# Altium footprint library Connectors.PcbLib: 60 footprints (part 2 of 4)
Each footprint in its own frame and in the unit in brackets; x right, y up, seen from the top. Pads: shape width x height; smd on the part's side, far side on the other; paste and mask are expansions set on the pad; w line width, h text height; cw(c..) or ccw(c..) is an arc to the next point about the centre after c.
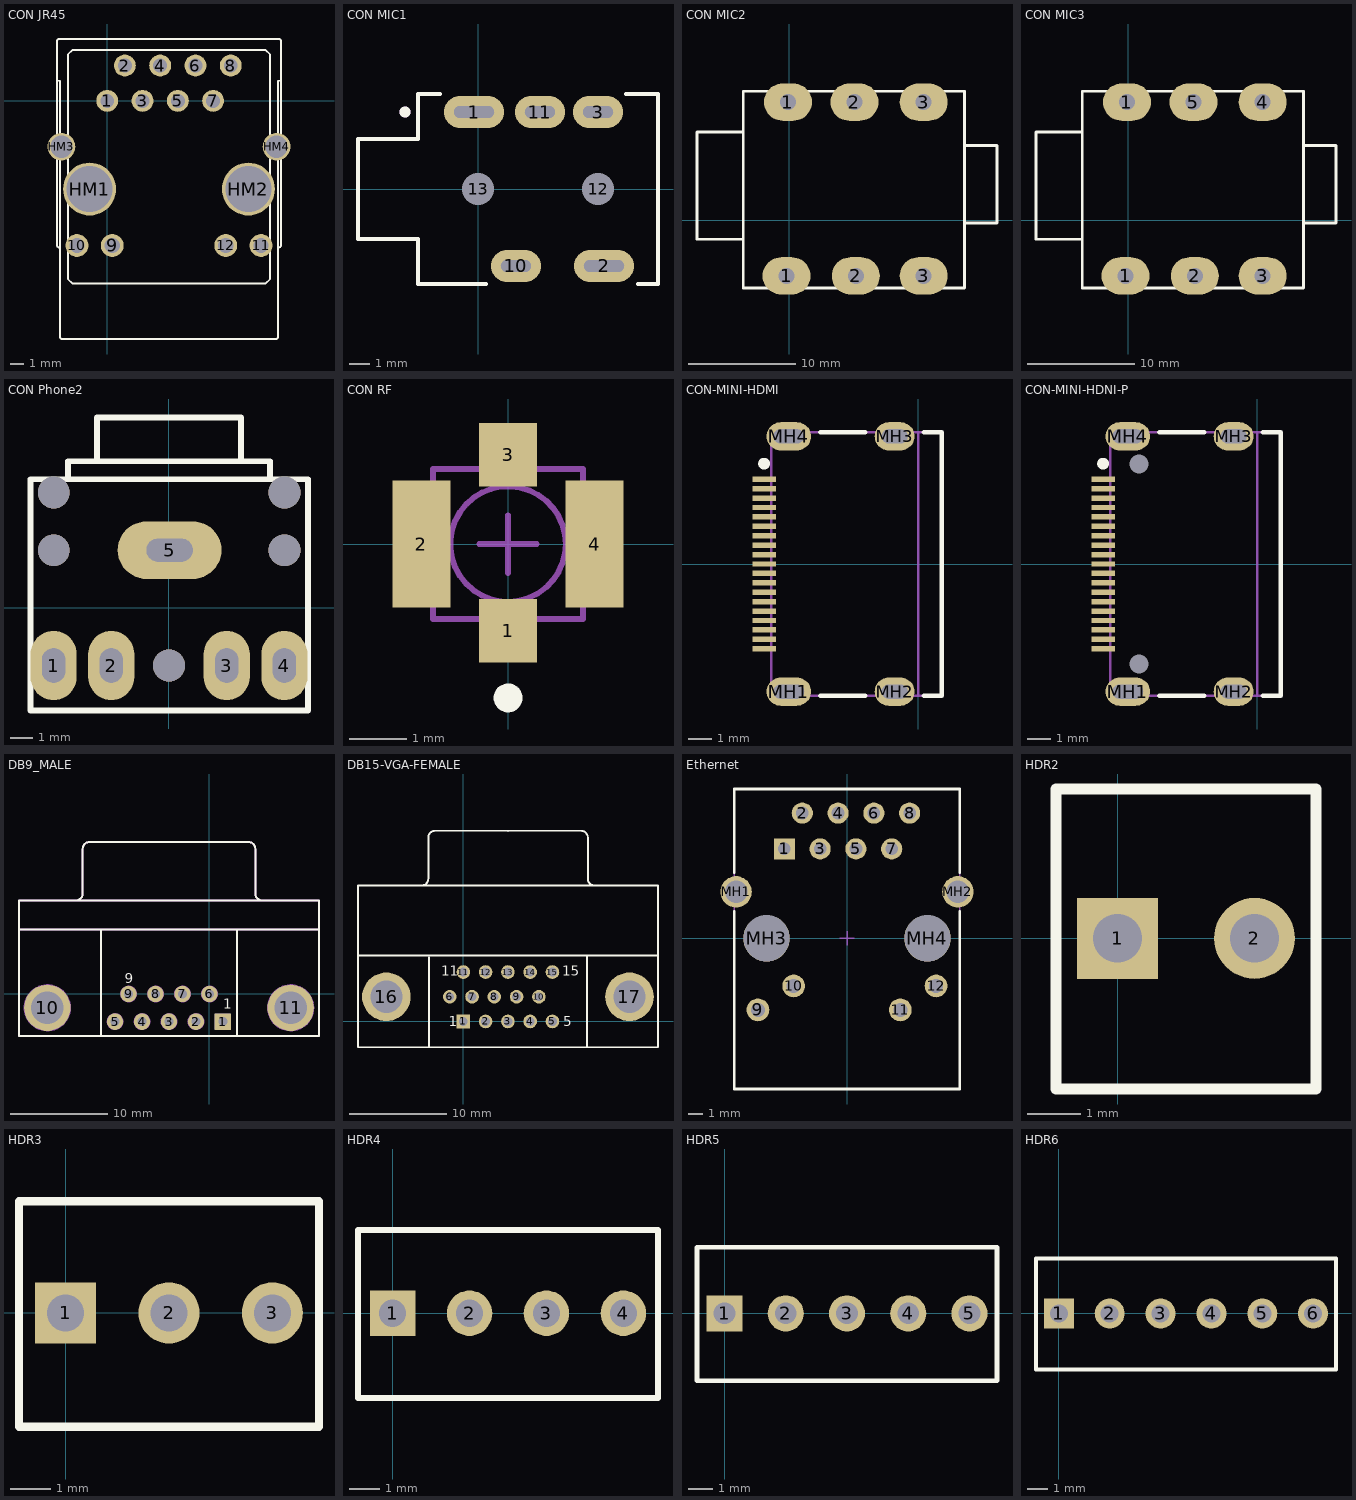
[diagram p1: the footprints below, top view; thin cyan lines are the x and y axes]

## CON JR45 [mm]
pads (16):
  round 1.575 hole 1: 1(0,0) 2(1.27,2.54) 3(2.54,0) 4(3.81,2.54) 5(5.08,0) 6(6.35,2.54) 7(7.62,0) 8(8.89,2.54)
  round 1.65 hole 1.1: 9(0.36,-10.41) 10(-2.18,-10.41) 11(11.07,-10.41) 12(8.53,-10.41)
  round 3.81 hole 3.3: HM1(-1.27,-6.35) HM2(10.16,-6.35)
  round 2 hole 1.6: HM3(-3.3,-3.3) HM4(12.19,-3.3)
Top Overlay:
  lines w0.127: -3.62,1.45 -3.405,1.45 -3.405,-16.99 ccw(c-3.255,-16.99) -3.255,-17.14 12.145,-17.14 ccw(c12.145,-16.99) 12.295,-16.99 12.295,1.45 12.51,1.45 ; -3.405,-10.55 -3.47,-10.55 cw(c-3.47,-10.4) -3.62,-10.4 -3.62,4.3 cw(c-3.47,4.3) -3.47,4.45 12.36,4.45 cw(c12.36,4.3) 12.51,4.3 12.51,-10.4 cw(c12.36,-10.4) 12.36,-10.55 12.295,-10.55 ; -3.405,-3.81 -3.195,-3.81 -3.195,-2.79 -3.405,-2.79 ; -3.405,-3.61 -3.195,-3.61 ; -3.405,-2.99 -3.195,-2.99 ; -1.77,-7.764 cw(c-1.27,-6.35) -1.517,-7.829 ; -0.77,-7.764 ccw(c-1.27,-6.35) -0.77,-4.936 ; -0.132,-0.1 -0.132,0.1 ; 0.132,-0.1 0.132,0.1 ; 1.138,2.44 1.138,2.64 ; 1.402,2.44 1.402,2.64 ; 2.408,-0.1 2.408,0.1 ; 2.672,-0.1 2.672,0.1 ; 3.678,2.44 3.678,2.64 ; 3.942,2.44 3.942,2.64 ; 4.948,-0.1 4.948,0.1 ; 5.212,-0.1 5.212,0.1 ; 6.218,2.44 6.218,2.64 ; 6.482,2.44 6.482,2.64 ; 7.488,-0.1 7.488,0.1 ; 7.752,-0.1 7.752,0.1 ; 8.758,2.44 8.758,2.64 ; 9.022,2.44 9.022,2.64 ; 9.66,-7.764 cw(c10.16,-6.35) 9.66,-4.936 ; 10.16,-7.85 cw(c10.16,-6.35) 10.66,-7.764 ; 12.085,-3.61 12.295,-3.61 ; 12.085,-2.99 12.295,-2.99 ; 12.295,-3.81 12.085,-3.81 12.085,-2.79 12.295,-2.79 ; -2.82,-12.84 -2.82,3.35 -2.52,3.65 11.41,3.65 11.71,3.35 11.71,-12.84 11.41,-13.14 -2.52,-13.14 -2.82,-12.84 ; -2.43,-10.61 -2.43,-10.21 -1.93,-10.21 -1.93,-10.61 -2.43,-10.61 ; -1.77,-7.386 cw(c-1.27,-6.35) -1.77,-5.314 -1.77,-7.386 ; -0.77,-7.386 ccw(c-1.27,-6.35) -0.77,-5.314 -0.77,-7.386 ; -0.175,-0.1 -0.175,0.1 0.175,0.1 0.175,-0.1 -0.175,-0.1 ; 0.11,-10.61 0.11,-10.21 0.61,-10.21 0.61,-10.61 0.11,-10.61 ; 1.095,2.44 1.095,2.64 1.445,2.64 1.445,2.44 1.095,2.44 ; 2.365,-0.1 2.365,0.1 2.715,0.1 2.715,-0.1 2.365,-0.1 ; 3.635,2.44 3.635,2.64 3.985,2.64 3.985,2.44 3.635,2.44 ; 4.905,-0.1 5.255,-0.1 5.255,0.1 4.905,0.1 4.905,-0.1 ; 6.175,2.44 6.525,2.44 6.525,2.64 6.175,2.64 6.175,2.44 ; 7.445,-0.1 7.445,0.1 7.795,0.1 7.795,-0.1 7.445,-0.1 ; 8.28,-10.61 8.28,-10.21 8.78,-10.21 8.78,-10.61 8.28,-10.61 ; 8.715,2.44 8.715,2.64 9.065,2.64 9.065,2.44 8.715,2.44 ; 9.66,-7.386 cw(c10.16,-6.35) 9.66,-5.314 9.66,-7.386 ; 10.66,-7.386 ccw(c10.16,-6.35) 10.66,-5.314 10.66,-7.386 ; 10.82,-10.61 10.82,-10.21 11.32,-10.21 11.32,-10.61 10.82,-10.61
3D body "RJ45-SI-60062-F.STEP": height 13.84, standoff -3.35, extent -3.62,-17.143 12.51,4.447

## CON MIC1 [mm]
pads (7):
  oval 3x1.6 hole 0.6 slot 2 at 0 deg: 1(-0.2,3.85) 2(6.3,-3.85)
  oval 2.5x1.6 hole 0.6 slot 1.5 at 0 deg: 3(6,3.85) 10(1.9,-3.85) 11(3.1,3.85)
  round 1.3 hole 1.6 unplated: 12(6,0) 13(0,0)
Top Overlay:
  circle w0.3: c-3.65,3.85 r0.125
  lines w0.2: -1.9,4.75 -3,4.75 -3,2.5 -6,2.5 -6,-2.5 -3,-2.5 -3,-4.75 0.4,-4.75 ; 7.4,4.75 9,4.75 9,-4.75 8,-4.75
Mechanical 7:
  circle w0.3: c-3.65,3.85 r0.125
  lines w0.1: -1.9,4.75 -3,4.75 -3,2.5 -6,2.5 -6,-2.5 -3,-2.5 -3,-4.75 0.4,-4.75 ; 7.4,4.75 9,4.75 9,-4.75 8,-4.75
3D body "stereojackblack3-5.STEP": height 5, standoff 0, extent -5.975,-4.725 9.025,4.775
3D body: height 0, standoff -2, extent 5.683,-3.978 6.974,-3.673
3D body: height 0, standoff -2, extent -0.797,3.698 0.494,4.003
3D body: height 0, standoff -2, extent 1.35,-4.045 2.414,-3.741
3D body: height 0, standoff -2, extent 2.577,3.688 3.642,3.992
3D body: height 0, standoff -2, extent 5.488,3.71 6.552,4.014

## CON MIC2 [mm]
pads (6):
  oval 4.5x3.5 hole 1.5: 1(-0.254,-5.207) 1(-0.127,11.049) 2(6.096,11.049) 2(6.223,-5.207) 3(12.573,-5.207) 3(12.573,11.049)
Top Overlay:
  lines w0.254: -4.318,-1.778 -8.636,-1.778 -8.636,8.255 -4.318,8.255 ; 16.383,-0.254 19.431,-0.254 19.431,6.985 16.383,6.985 ; -4.318,-6.35 16.383,-6.35 16.383,11.938 16.383,12.065 -4.318,12.065 -4.318,-6.35
3D body "User Library-Audio Jack Neutrik Amphenol 6_35.STEP": height 16.3, standoff -3.64, extent -12.468,-6.232 19.326,11.968

## CON MIC3 [mm]
pads (6):
  oval 4.5x3.5 hole 1.5: 1(-0.254,-5.207) 1(-0.127,11.049) 2(6.223,-5.207) 3(12.573,-5.207) 4(12.573,11.049) 5(6.096,11.049)
Top Overlay:
  lines w0.254: -4.318,-1.778 -8.636,-1.778 -8.636,8.255 -4.318,8.255 ; 16.383,-0.254 19.431,-0.254 19.431,6.985 16.383,6.985 ; -4.318,-6.35 16.383,-6.35 16.383,11.938 16.383,12.065 -4.318,12.065 -4.318,-6.35
3D body "User Library-Audio Jack Neutrik Amphenol 6_35.STEP": height 16.3, standoff -3.64, extent -12.468,-6.232 19.326,11.968

## CON Phone2 [mil]
pads (5):
  oval 80x120 hole 40 slot 60 at 90 deg: 1(-200,-100) 2(-100,-100) 3(100,-100) 4(200,-100)
  oval 180x100 hole 40 slot 80 at 0 deg: 5(1,100)
via -200,200 diameter 55 hole 55
via 200,200 diameter 55 hole 55
via 0,-100 diameter 55 hole 55
via -200,100 diameter 55 hole 55
via 200,100 diameter 55 hole 55
Top Overlay:
  lines w10: -240,219 -240,-178 ; -175,224 -175,254 175,254 175,226 174,225 ; -125,255 -125,330 125,330 ; 125,329 125,256 126,255 ; 240,-178 -240,-178 ; -240,-178 241,-178 241,223 -240,223 -240,-178
3D body "SW3dPS-CONNECTOR, PHONE JACK, STEREO, 3.5 MM, SEE-PLUS ST-3536-02HG.STEP": height 394.3, standoff -137.19, extent -239,-201.56 233.44,353.56

## CON RF [mm] "Microcoaxial RF, 50 Ohm, PCB Vertical Jack Receptacle, SMT, 1.25mm Mounted Height"
height 1.3
pads (4):
  rect 1x1.1 smd: 1(0,-1.5) 3(0,1.55)
  rect 1x2.2 smd: 2(-1.5,0) 4(1.5,0)
Top Overlay:
  circle w0.25: c0.002,-2.667 r0.125
Mechanical 13:
  circle w0.1: c0,0 r1
  lines w0.1: -1.3,-1.3 -1.3,1.3 1.3,1.3 1.3,-1.3 -1.3,-1.3
Mechanical 15:
  lines w0.1: -0.5,0 0.5,0 ; 0,-0.5 0,0.5
3D body: height 0.35, standoff 0, extent -1.299,-1.299 1.299,1.299
3D body: height 1.3, standoff 0.1, extent -1.126,-1.116 1.102,1.113
3D body: height 1.3, standoff 0.1, extent -1.124,-1.114 1.104,1.115
3D body: height 1, standoff 0.1, extent -0.256,-0.272 0.253,0.237

## CON-MINI-HDMI [mm] "Connector; mini-HDMI, SM, 19 Position, Right Angle, Body 7.9 x 11.2 x 3.3 mm (LxWxH)"
height 3.3
pads (23):
  rect 1x0.23 smd: 1(-6.55,3.6) 2(-6.55,3.2) 3(-6.55,2.8) 4(-6.55,2.4) 5(-6.55,2) 6(-6.55,1.6) 7(-6.55,1.2) 8(-6.55,0.8) 9(-6.55,0.4) 10(-6.55,0) 11(-6.55,-0.4) 12(-6.55,-0.8) 13(-6.55,-1.2) 14(-6.55,-1.6) 15(-6.55,-2) 16(-6.55,-2.4) 17(-6.55,-2.8) 18(-6.55,-3.2) 19(-6.55,-3.6)
  oval 1.9x1.2 hole 0.6 slot 1.3 at 0 deg: MH1(-5.5,-5.425) MH4(-5.5,5.425)
  oval 1.7x1.2 hole 0.6 slot 1.1 at 0 deg: MH2(-1,-5.425) MH3(-1,5.425)
Top Overlay:
  circle w0.25: c-6.55,4.265 r0.125
  lines w0.2: -4.15,-5.6 -2.25,-5.6 ; -4.15,5.6 -2.25,5.6 ; 0.25,-5.6 1,-5.6 1,5.6 0.25,5.6
Mechanical 1:
  lines w0.1: 0,-5.6 0,5.6
  text "PCB Edge" at -0.3,-4.725 h0.25
Mechanical 13:
  lines w0.1: -6.25,-5.6 -6.25,5.6 1,5.6 1,-5.6 -6.25,-5.6
3D body "685119136923.stp": height 1.8, standoff -3.65, extent -6.865,-5.6 1.035,5.6

## CON-MINI-HDNI-P [mm] "Connector; mini-HDMI, SM, 19 Position, Right Angle, Body 7.9 x 11.2 x 3.3 mm (LxWxH), post"
height 3.3
pads (25):
  rect 1x0.23 smd: 1(-6.55,3.6) 2(-6.55,3.2) 3(-6.55,2.8) 4(-6.55,2.4) 5(-6.55,2) 6(-6.55,1.6) 7(-6.55,1.2) 8(-6.55,0.8) 9(-6.55,0.4) 10(-6.55,0) 11(-6.55,-0.4) 12(-6.55,-0.8) 13(-6.55,-1.2) 14(-6.55,-1.6) 15(-6.55,-2) 16(-6.55,-2.4) 17(-6.55,-2.8) 18(-6.55,-3.2) 19(-6.55,-3.6)
  oval 1.9x1.2 hole 0.6 slot 1.3 at 0 deg: MH1(-5.5,-5.425) MH4(-5.5,5.425)
  oval 1.7x1.2 hole 0.6 slot 1.1 at 0 deg: MH2(-1,-5.425) MH3(-1,5.425)
  round 0.5 hole 0.8 unplated: MH5(-5.025,-4.25) MH6(-5.025,4.25)
Top Overlay:
  circle w0.25: c-6.55,4.265 r0.125
  lines w0.2: -4.15,-5.6 -2.25,-5.6 ; -4.15,5.6 -2.25,5.6 ; 0.25,-5.6 1,-5.6 1,5.6 0.25,5.6
Mechanical 1:
  lines w0.1: 0,-5.6 0,5.6
  text "PCB Edge" at -0.3,-4.725 h0.25
Mechanical 13:
  lines w0.1: -6.25,-5.6 -6.25,5.6 1,5.6 1,-5.6 -6.25,-5.6
3D body "685119136923.stp": height 1.8, standoff -3.65, extent -6.865,-5.6 1.035,5.6

## DB9_MALE [mm]
height 1
pads (11):
  rect 1.69x1.69 hole 0.9: 1(1.385,-2.84)
  round 1.69 hole 0.9: 2(-1.385,-2.84) 3(-4.155,-2.84) 4(-6.925,-2.84) 6(0,0) 7(-2.77,0) 8(-5.54,0) 9(-8.31,0)
  round 1.69 hole 0.9 mask+0: 5(-9.695,-2.84)
  round 4.76 hole 3.3: 10(-16.65,-1.42) 11(8.34,-1.42)
Top Overlay:
  lines w0.2: -19.555,6.604 11.245,6.604 ; -13.715,9.609 ccw(c-13.715,10.304) -13.02,10.304 -13.02,14.904 ; -13.015,14.909 cw(c-12.32,14.909) -12.32,15.604 4.01,15.604 cw(c4.01,14.909) 4.705,14.909 ; -11.155,-4.32 -11.155,6.604 ; 2.845,-4.32 2.845,6.604 ; 4.71,14.904 4.71,10.304 ccw(c5.405,10.304) 5.405,9.609 ; -19.555,-4.32 11.245,-4.32 11.245,9.604 -19.555,9.604 -19.555,-4.32
  text "9" at -8.709,1.095 h1
  text "1" at 1.4,-1.5 h1
Mechanical 7:
  circle w0.2: c-16.65,-1.42 r2.327
  circle w0.2: c8.34,-1.42 r2.327
  circle w0.2: c0,0 r0.773
  circle w0.2: c-2.77,0 r0.773
  circle w0.2: c-5.54,0 r0.773
  circle w0.2: c-8.31,0 r0.773
  circle w0.2: c-9.695,-2.84 r0.773
  circle w0.2: c-6.925,-2.84 r0.773
  circle w0.2: c-4.155,-2.84 r0.773
  circle w0.2: c-1.385,-2.84 r0.773
  lines w0.2: -19.555,6.604 11.245,6.604 ; -13.715,9.609 ccw(c-13.715,10.304) -13.02,10.304 -13.02,14.904 ; -13.015,14.909 cw(c-12.32,14.909) -12.32,15.604 4.01,15.604 cw(c4.01,14.909) 4.705,14.909 ; -11.155,-4.32 -11.155,6.604 ; 2.845,-4.32 2.845,6.604 ; 4.71,14.904 4.71,10.304 ccw(c5.405,10.304) 5.405,9.609 ; -19.555,-4.32 -19.555,9.604 11.245,9.604 11.245,-4.32 -19.555,-4.32 ; 0.635,-3.59 0.635,-2.84 0.635,-2.09 2.135,-2.09 2.135,-3.59 0.635,-3.59
3D body: height 4.5, standoff 4, extent -18.528,-1.113 -14.985,5.568
3D body: height 4.5, standoff 4, extent 6.626,-0.892 10.169,5.789
3D body: height 4, standoff -3, extent 8.804,-1.354 9.749,-0.899
3D body: height 4, standoff -3, extent 6.914,-1.537 7.981,-0.808
3D body: height 4, standoff -3, extent -16.299,-1.641 -15.232,-0.912
3D body: height 4, standoff -3, extent -18.067,-1.549 -17.122,-1.095
3D body "SW3DPS-DB9RA_copy.STEP": height 12.66, standoff -3.39, extent -19.848,-4.328 11.466,16.376

## DB15-VGA-FEMALE [mm]
pads (17):
  rect 1.4x1.4 hole 0.9: 1(0,0)
  round 1.4 hole 0.9: 2(2.29,0) 3(4.58,0) 4(6.87,0) 9(5.47,2.54) 11(0,5.08) 12(2.29,5.08) 13(4.58,5.08) 14(6.87,5.08) 15(9.16,5.08)
  round 1.4 hole 0.9 mask+0: 5(9.16,0) 6(-1.4,2.54) 7(0.89,2.54) 8(3.18,2.54) 10(7.76,2.54)
  round 5 hole 3.3: 16(-7.915,2.54) 17(17.075,2.54)
Top Overlay:
  lines w0.2: -10.83,6.77 20.01,6.77 ; -4.3,13.975 ccw(c-4.3,14.67) -3.605,14.67 -3.605,18.91 cw(c-2.91,18.91) -2.91,19.605 4.595,19.59 12.1,19.605 cw(c12.1,18.91) 12.795,18.91 12.795,14.67 ccw(c13.49,14.67) 13.49,13.975 ; -3.535,-2.65 -3.535,6.57 ; 12.725,-2.65 12.725,6.65 ; -10.83,-2.65 -10.83,13.97 20.01,13.97 20.01,-2.65 -10.83,-2.65
  text "15" at 10.16,4.699 h1
  text "5" at 10.287,-0.508 h1
  text "11" at -2.286,4.699 h1
  text "1" at -1.524,-0.508 h1
3D body "SW3dPS-vga connector.STEP": height 14.3, standoff -0.79, extent -12.272,14.986 21.416,60.116
3D body "DB15 Analog RGB.stp": height 12.75, standoff -3.75, extent -10.935,-1.672 20.065,20.828

## Ethernet [mm] "Connector; PCB Jack, Thru-Hole; 1-Port, 8 Positions, 8 Loaded; Shielded without Lightpipes; Vertical"
height 16.5
pads (16):
  rect 1.5x1.5 hole 0.9: 1(-4.445,6.35)
  round 1.5 hole 0.9: 2(-3.175,8.89) 3(-1.905,6.35) 4(-0.635,8.89) 5(0.635,6.35) 6(1.905,8.89) 7(3.175,6.35)
  round 1.5 hole 0.9 mask+0: 8(4.445,8.89)
  round 1.62 hole 1: 9(-6.325,-5.08) 11(3.785,-5.08) 12(6.325,-3.38)
  round 1.62 hole 1 mask+0: 10(-3.785,-3.38)
  round 2.23 hole 1.6: MH1(-7.875,3.3) MH2(7.875,3.3)
  round 3.3 hole 3.3 unplated: MH3(-5.715,0) MH4(5.715,0)
Top Overlay:
  lines w0.2: -8,1.905 -8,-10.7 8,-10.7 8,1.905 ; -8,4.665 -8,10.6 8,10.6 8,4.665
Mechanical 13:
  lines w0.1: -8,-10.7 8,-10.7 8,10.6 -8,10.6 -8,-10.7
Mechanical 15:
  lines w0.1: -0.5,0 0.5,0 ; 0,-0.5 0,0.5
3D body "RJ45cat5step.stp": height 24.61, standoff -2.07, extent -6.043,-145.273 5.637,2.095
3D body "alteredRJstep.STEP": height 13.14, standoff -3.9, extent -7.897,-10.71 7.968,10.601

## HDR2 [mm] "Connector; Header; 2 Position"
pads (2):
  rect 1.5x1.5 hole 0.9: 1(0,0)
  round 1.5 hole 0.9: 2(2.54,0)
Top Overlay:
  lines w0.2: -1.143,-2.794 3.683,-2.794 3.683,2.769 -1.143,2.769 -1.143,-2.794
3D body "h2.stp": height 11.72, standoff -3.54, extent -1.27,-2.92 3.81,2.88

## HDR3 [mm] "Connector; Header; 3 Position"
pads (3):
  rect 1.5x1.5 hole 0.9: 1(0,0)
  round 1.5 hole 0.9: 2(2.54,0) 3(5.08,0)
Top Overlay:
  lines w0.2: -1.143,-2.794 -1.143,2.743 6.223,2.743 6.223,-2.794 -1.143,-2.794
3D body "h3.stp": height 11.72, standoff -3.54, extent -1.27,-2.92 6.35,2.88

## HDR4 [mm] "Connector; Header; 4 Position"
pads (4):
  rect 1.5x1.5 hole 0.9: 1(0,0)
  round 1.5 hole 0.9: 2(2.54,0) 3(5.08,0) 4(7.62,0)
Top Overlay:
  lines w0.2: -1.143,-2.794 -1.143,2.743 8.763,2.743 8.763,-2.794 -1.143,-2.794
3D body "h4.stp": height 11.72, standoff -3.54, extent -1.27,-2.92 8.89,2.88

## HDR5 [mm] "Connector; Header; 5 Position"
pads (5):
  rect 1.5x1.5 hole 0.9: 1(0,0)
  round 1.5 hole 0.9: 2(2.54,0) 3(5.08,0) 4(7.62,0) 5(10.16,0)
Top Overlay:
  lines w0.2: -1.143,-2.794 11.303,-2.794 11.303,2.743 -1.143,2.743 -1.143,-2.794
3D body "h5.stp": height 11.72, standoff -3.54, extent -1.27,-2.92 11.43,2.88

## HDR6 [mm] "Connector; Header; 6 Position"
pads (6):
  rect 1.5x1.5 hole 0.9: 1(0,0)
  round 1.5 hole 0.9: 2(2.54,0) 3(5.08,0) 4(7.62,0) 5(10.16,0) 6(12.7,0)
Top Overlay:
  lines w0.2: -1.143,-2.794 13.843,-2.794 13.843,2.743 -1.143,2.743 -1.143,-2.794
3D body "h6.stp": height 11.72, standoff -3.54, extent -1.27,-2.92 13.97,2.88